# Altium footprint library LDCN Components.PcbLib: 426 footprints (part 21 of 27)
Each footprint in its own frame and in the unit in brackets; x right, y up, seen from the top. Pads: shape width x height; smd on the part's side, far side on the other; paste and mask are expansions set on the pad; w line width, h text height; cw(c..) or ccw(c..) is an arc to the next point about the centre after c.
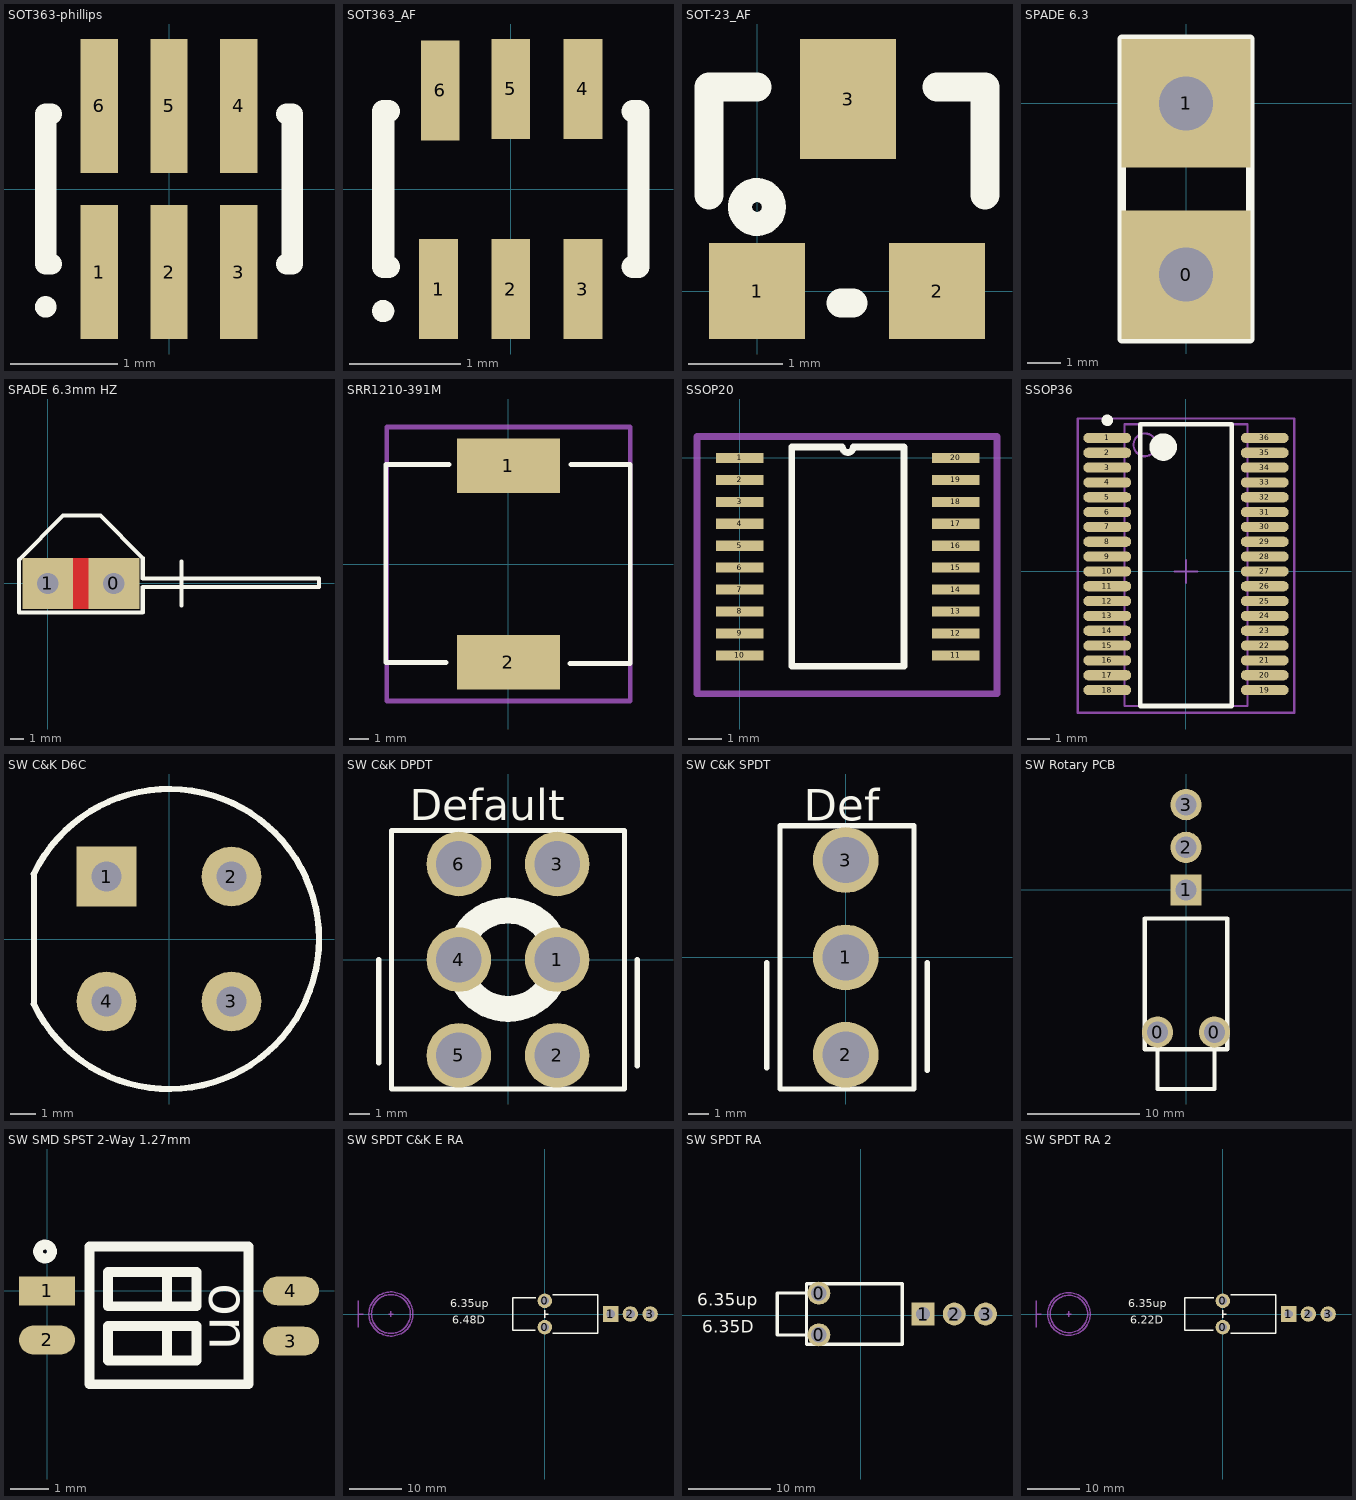
[diagram p20: the footprints below, top view; thin cyan lines are the x and y axes]

## SOT363-phillips [mm] "SOT-363/SC-88; 6 Leads; Body 2.2 x 2.2 mm, inc. leads (LxW max)"
height 1.1
pads (6):
  rect 0.35x1.25 smd: 1(-0.65,-0.775) 2(0,-0.775) 3(0.65,-0.775) 4(0.65,0.775) 5(0,0.775) 6(-0.65,0.775)
Top Overlay:
  circle w0.1: c-1.15,-1.1 r0.05
  lines w0.2: -1.1,-0.7 -1.15,-0.7 -1.15,0.7 -1.1,0.7 ; 1.1,-0.7 1.15,-0.7 1.15,0.7 1.1,0.7

## SOT363_AF [mm] "SOT-363/SC-88; 6 Leads; Body 2.2 x 2.2 mm, inc. leads (LxW max)"
height 1.1
pads (6):
  rect 0.35x0.9 smd: 1(-0.65,-0.902) 2(0,-0.902) 3(0.65,-0.902) 4(0.65,0.902) 5(0,0.902) 6(-0.635,0.889)
Top Overlay:
  circle w0.1: c-1.15,-1.1 r0.05
  lines w0.2: -1.1,-0.7 -1.15,-0.7 -1.15,0.7 -1.1,0.7 ; 1.1,-0.7 1.15,-0.7 1.15,0.7 1.1,0.7

## SOT-23_AF [mil]
pads (3):
  rect 40x40 smd: 1(0,0) 2(75,0)
  rect 40x50 smd: 3(38,80)
Top Overlay:
  circle w10: c0,35 r7.07
  lines w12: -20,40 -20,85 0,85 ; 35,-5 40,-5 ; 75,85 95,85 95,40

## SPADE 6.3 [mm]
pads (2):
  rect 3.81x3.81 hole 1.6: 0(0,-5.08) 1(0,0)
Top Overlay:
  lines w0.254: -1.905,-6.985 1.905,-6.985 1.905,1.905 -1.905,1.905 -1.905,-6.985

## SPADE 6.3mm HZ [mm]
pads (2):
  rect 3.81x3.81 hole 1.6: 0(4.953,0) 1(0,0)
Top Layer:
  region: 3.81,-1.905 3.81,1.905 1.27,1.905 1.27,-1.905
Bottom Layer:
  region: 3.81,-1.905 3.81,1.905 1.27,1.905 1.27,-1.905
Top Overlay:
  lines w0.305: 10.033,-1.651 10.033,1.651 ; -2.159,-2.159 -2.159,-1.905 -2.159,1.778 1.143,5.08 3.937,5.08 7.112,1.905 7.112,0.381 14.986,0.381 20.32,0.381 20.32,-0.254 14.859,-0.254 7.112,-0.254 7.112,-2.159 -2.159,-2.159

## SRR1210-391M [mm] "Bourns SRR1210 SMD Power Inductor"
height 10
pads (2):
  rect 5.3x2.8 smd: 1(0,5.05) 2(0,-5.05)
Top Overlay:
  lines w0.254: -3.2,-5.05 -6.3,-5.05 -6.3,-2.512 -6.3,2.562 -6.3,5.1 -3.05,5.1 ; 3.15,-5.1 6.25,-5.1 6.25,5.1 3.2,5.1
Mechanical 1:
  lines w0.254: -6.25,-7.025 6.25,-7.025 6.25,7.025 -6.25,7.025 -6.25,-7.025
3D body "srr1210.stp": height 10.01, standoff 0.01, extent -6,-5.7 6,6.3

## SSOP20 [mm]
pads (20):
  rect 1.4x0.3 smd mask+0.2: 1(0,0) 2(0,-0.65) 3(0,-1.3) 4(0,-1.95) 5(0,-2.6) 6(0,-3.25) 7(0,-3.9) 8(0,-4.55) 9(0,-5.2) 10(0,-5.85) 11(6.4,-5.85) 12(6.4,-5.2) 13(6.4,-4.55) 14(6.4,-3.9) 15(6.4,-3.25) 16(6.4,-2.6) 17(6.4,-1.95) 18(6.4,-1.3) 19(6.4,-0.65) 20(6.4,0)
Top Overlay:
  lines w0.2: 1.535,-6.175 4.865,-6.175 4.865,0.325 3.362,0.325 cw(c3.2,0.325) 3.037,0.325 1.535,0.325 1.535,-6.175
Mechanical 15:
  lines w0.2: -1.27,-6.985 -1.27,0.635 7.62,0.635 7.62,-6.985 -1.27,-6.985

## SSOP36 [mm]
pads (36):
  oval 2.1x0.45 smd: 1(-3.45,5.85) 2(-3.45,5.2) 3(-3.45,4.55) 4(-3.45,3.9) 5(-3.45,3.25) 6(-3.45,2.6) 7(-3.45,1.95) 8(-3.45,1.3) 9(-3.45,0.65) 10(-3.45,0) 11(-3.45,-0.65) 12(-3.45,-1.3) 13(-3.45,-1.95) 14(-3.45,-2.6) 15(-3.45,-3.25) 16(-3.45,-3.9) 17(-3.45,-4.55) 18(-3.45,-5.2) 19(3.45,-5.2) 20(3.45,-4.55) 21(3.45,-3.9) 22(3.45,-3.25) 23(3.45,-2.6) 24(3.45,-1.95) 25(3.45,-1.3) 26(3.45,-0.65) 27(3.45,0) 28(3.45,0.65) 29(3.45,1.3) 30(3.45,1.95) 31(3.45,2.6) 32(3.45,3.25) 33(3.45,3.9) 34(3.45,4.55) 35(3.45,5.2) 36(3.45,5.85)
Top Overlay:
  circle w0.6: c-1,5.45 r0.3
  circle w0.25: c-3.45,6.625 r0.125
  lines w0.2: -2,-5.9 2,-5.9 2,6.45 -2,6.45 -2,-5.9
Mechanical 13:
  circle w0.1: c-1.8,5.55 r0.5
  lines w0.1: -2.7,-5.9 2.7,-5.9 2.7,6.45 -2.7,6.45 -2.7,-5.9
Mechanical 15:
  lines w0.1: -0.5,0 0.5,0 ; 0,-0.5 0,0.5 ; -4.75,-6.2 4.75,-6.2 4.75,6.7 -4.75,6.7 -4.75,-6.2
3D body: height 2, standoff 0, extent -2.7,-5.9 2.7,6.45

## SW C&K D6C [mm]
pads (4):
  rect 2.4x2.4 hole 1.2: 1(-2.5,2.5)
  round 2.4 hole 1.2: 2(2.5,2.5) 3(2.5,-2.5) 4(-2.5,-2.5)
Top Overlay:
  lines w0.254: -5.406,-2.603 ccw(c0,0) -5.406,2.603 ; -5.4,-2.603 -5.4,2.603

## SW C&K DPDT [mil]
pads (6):
  round 125 hole 88: 1(95,0) 2(95,-185) 3(95,185) 4(-95,0) 5(-95,-185) 6(-95,185)
Top Overlay:
  circle w50: c0,0 r95
  lines w10: -250,-200 -250,0 ; 250,-205 250,0 ; -225,-250 225,-250 225,250 -225,250 -225,-250
  text "Default" at -190,270 h60

## SW C&K SPDT [mil]
pads (3):
  round 125 hole 88: 1(0,0) 2(0,-185) 3(0,185)
Top Overlay:
  lines w10: -150,-210 -150,-10 ; 155,-215 155,-10 ; -125,-250 130,-250 130,250 -125,250 -125,-250
  text "Def" at -80,260 h60

## SW Rotary PCB [mil]
pads (5):
  round 110 hole 75: 0(-100,-500) 0(100,-500) 2(0,150) 3(0,300)
  rect 110x110 hole 75: 1(0,0)
Top Overlay:
  lines w15: -100,-560 -100,-700 100,-700 100,-560 ; -145,-560 145,-560 145,-100 -145,-100 -145,-560

## SW SMD SPST 2-Way 1.27mm [mm]
height 5
pads (4):
  rect 1.45x0.75 smd: 1(0,0)
  oval 1.45x0.75 smd: 2(0,-1.27) 3(6.3,-1.3) 4(6.3,0)
Top Overlay:
  circle w0.254: c-0.053,1.016 r0.18
  lines w0.254: 3.1,-1.797 3.1,-0.908 ; 3.1,-0.4 3.1,0.489 ; 1.1,-2.413 1.1,1.143 5.2,1.143 5.2,-2.413 1.1,-2.413 ; 1.576,-1.797 1.576,-0.908 3.862,-0.908 3.862,-1.797 1.576,-1.797 ; 1.576,-0.4 3.862,-0.4 3.862,0.489 1.576,0.489 1.576,-0.4
  text "on" at 4.2,0.2 h1.02

## SW SPDT C&K E RA [mm] "C&K E-Series RA Insulated Unthreaded E101MD1AV2QE"
pads (5):
  round 2.8 hole 1.68: 0(0,-2.54) 0(0,2.54)
  rect 3x3 hole 1.68: 1(12.7,0)
  round 3 hole 1.68: 2(16.51,0) 3(20.32,0)
Top Overlay:
  lines w0.254: -1.8,-3.11 -6.17,-3.11 -6.17,3.11 -1.7,3.11 ; 0,-0.7 0,0.7 ; 0,0 0.7,0 ; 1.5,-3.683 10.16,-3.683 10.16,3.683 1.5,3.683
  text "6.48D" at -17.8,-1.9 h1.52
  text "6.35up" at -18.2,1.3 h1.52
Mechanical 21:
  circle w0.254: c-29.65,0 r3.75
Mechanical 22:
  lines w0.254: -36,-2.54 -36,0 ; -36,2.54 -36,0 ; -35,0 -36,0 ; -30.08,0 -29.18,0 ; -29.65,-0.5 -29.65,0.5
Mechanical 25:
  circle w0.254: c-29.65,0 r4.25

## SW SPDT RA [mil]
pads (5):
  round 110 hole 75: 0(-200,-95) 0(-200,105)
  rect 110x110 hole 66.93: 1(300,5)
  round 110 hole 66.93: 2(450,5) 3(600,5)
Top Overlay:
  lines w15: -260,-95 -400,-95 -400,105 -260,105 ; -260,-140 -260,150 200,150 200,-140 -260,-140
  text "6.35D" at -760,-85 h60
  text "6.35up" at -785,45 h60

## SW SPDT RA 2 [mm] "Multicomp 1MS1T2B4M7QE"
pads (5):
  round 2.8 hole 1.6: 0(0,-2.54) 0(0,2.54)
  rect 3x3 hole 1.6: 1(12.7,0)
  round 3 hole 1.6: 2(16.51,0) 3(20.32,0)
Top Overlay:
  lines w0.254: -1.8,-3.11 -7.31,-3.11 -7.31,3.11 -1.7,3.11 ; 0,-0.7 0,0.7 ; 0,0 0.7,0 ; 1.5,-3.683 10.16,-3.683 10.16,3.683 1.5,3.683
  text "6.22D" at -17.8,-1.9 h1.52
  text "6.35up" at -18.2,1.3 h1.52
Mechanical 21:
  circle w0.254: c-29.65,0 r3.6
Mechanical 22:
  lines w0.254: -36,-2.54 -36,0 ; -36,2.54 -36,0 ; -35,0 -36,0 ; -30.08,0 -29.18,0 ; -29.65,-0.5 -29.65,0.5
Mechanical 25:
  circle w0.254: c-29.65,0 r4.1